# Altium footprint library Custom_Library.PcbLib: 221 footprints (part 6 of 14)
Each footprint in its own frame and in the unit in brackets; x right, y up, seen from the top. Pads: shape width x height; smd on the part's side, far side on the other; paste and mask are expansions set on the pad; w line width, h text height; cw(c..) or ccw(c..) is an arc to the next point about the centre after c.
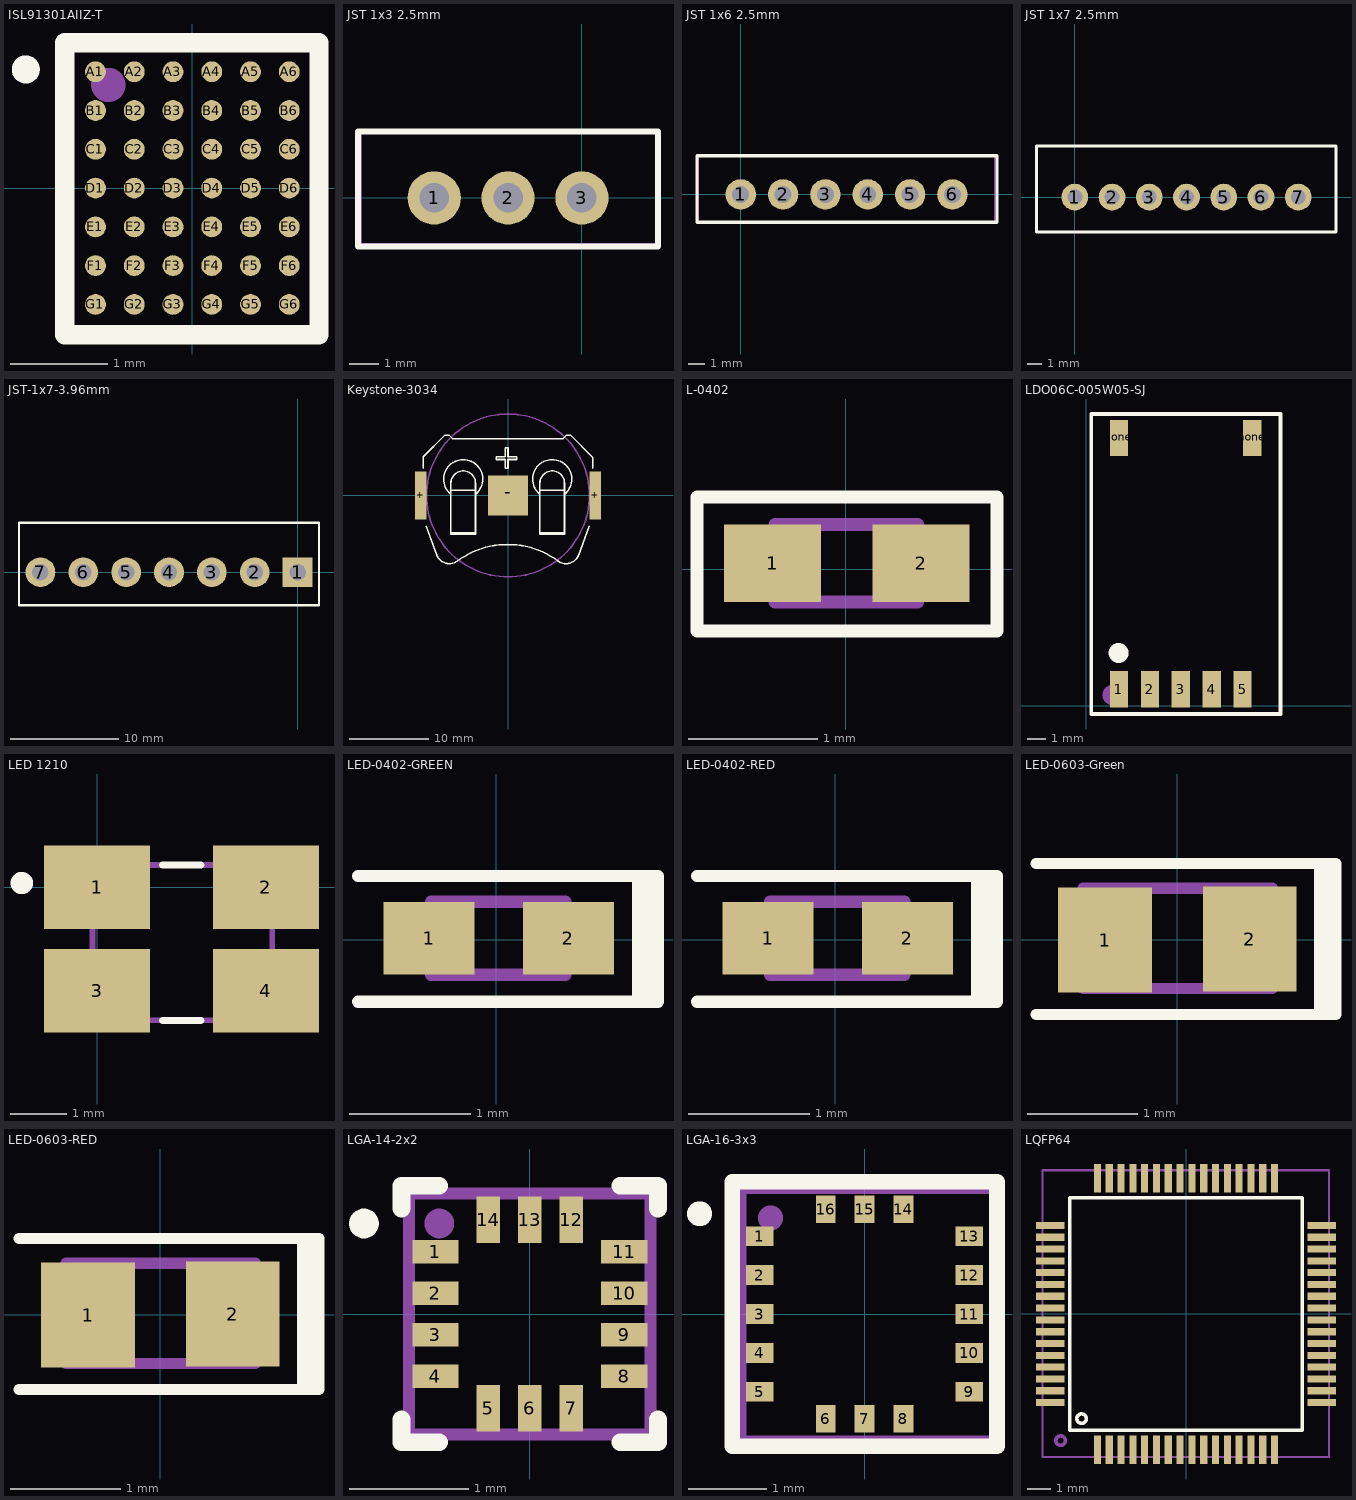
[diagram p5: the footprints below, top view; thin cyan lines are the x and y axes]

## ISL91301AIIZ-T [mm]
pads (42):
  round 0.215 smd mask+0.05: A1(-1,1.2) A2(-0.6,1.2) A3(-0.2,1.2) A4(0.2,1.2) A5(0.6,1.2) A6(1,1.2) B1(-1,0.8) B2(-0.6,0.8) B3(-0.2,0.8) B4(0.2,0.8) B5(0.6,0.8) B6(1,0.8) C1(-1,0.4) C2(-0.6,0.4) C3(-0.2,0.4) C4(0.2,0.4) C5(0.6,0.4) C6(1,0.4) D1(-1,0) D2(-0.6,0) D3(-0.2,0) D4(0.2,0) D5(0.6,0) D6(1,0) E1(-1,-0.4) E2(-0.6,-0.4) E3(-0.2,-0.4) E4(0.2,-0.4) E5(0.6,-0.4) E6(1,-0.4) F1(-1,-0.8) F2(-0.6,-0.8) F3(-0.2,-0.8) F4(0.2,-0.8) F5(0.6,-0.8) F6(1,-0.8) G1(-1,-1.2) G2(-0.6,-1.2) G3(-0.2,-1.2) G4(0.2,-1.2) G5(0.6,-1.2) G6(1,-1.2)
Top Overlay:
  circle w0.15: c-1.719,1.225 r0.07
  lines w0.2: -1.316,-1.513 1.306,-1.513 1.306,1.498 -1.316,1.498 -1.316,-1.513
Top Assembly:
  circle w0.254: c-0.868,1.064 r0.05
  lines w0.1: -1.31,-1.519 1.3,-1.519 1.3,1.5 -0.6,1.5 -1.31,1.5 -1.31,-1.519
  text "'.Designator'" at -3.213,-2.69 h1.27

## JST 1x3 2.5mm [mm]
pads (3):
  round 1.8 / inner round 1.499 / far side round 1.499 hole 1: 1(-5,0) 2(-2.5,0) 3(0,0)
Top Overlay:
  lines w0.2: -7.577,-1.641 2.574,-1.641 2.574,2.244 -7.577,2.244 -7.577,-1.641
Top Assembly:
  lines w0.1: -7.5,-1.574 -7.5,2.215 2.574,2.215 2.574,-1.574 -7.5,-1.574
  text "'.Designator'" at -5.973,1.732 h1.27
3D body: height 0.25, standoff 0, extent -5,0 -4.746,0.254
3D body "JST-B3B-EH-A.STEP": height 6, standoff -3.2, extent -7.497,-1.587 2.504,2.213

## JST 1x6 2.5mm [mm]
pads (6):
  round 1.8 / inner round 1.499 / far side round 1.499 hole 1: 1(0,0) 2(2.5,0) 3(5,0) 4(7.5,0) 5(10,0) 6(12.5,0)
Top Overlay:
  lines w0.2: -2.577,-1.627 -2.577,2.285 15.127,2.285 15.127,-1.627 -2.577,-1.627
Top Assembly:
  lines w0.1: -2.5,-1.638 15,-1.638 15,2.285 -2.5,2.285 -2.5,-1.638
  text "'.Designator'" at 2.666,1.653 h1.27
3D body: height 0.25, standoff 0, extent 0,0 0.254,0.254
3D body "JST-B6B-EH-A.STEP": height 6, standoff -3.2, extent -2.496,-1.593 15.004,2.207

## JST 1x7 2.5mm [mm]
pads (7):
  round 1.8 / inner round 1.499 / far side round 1.499 hole 1: 1(0,0) 2(2.5,0) 3(5,0) 4(7.5,0) 5(10,0) 6(12.5,0) 7(15,0)
Top Overlay:
  lines w0.2: -2.577,-2.331 -2.577,3.426 17.536,3.426 17.536,-2.331 -2.577,-2.331
Top Assembly:
  lines w0.1: -2.606,-2.341 17.504,-2.341 17.504,3.415 -2.606,3.415 -2.606,-2.341
  text "'.Designator'" at 2.666,1.653 h1.27
3D body: height 0.25, standoff 0, extent 0,0 0.254,0.254
3D body "JST B7B-XH-A Through-hole shrouded header top entry type.STEP": height 7.1, standoff -3.3, extent -2.581,-2.324 17.499,3.426

## JST-1x7-3.96mm [mm]
pads (7):
  rect 2.75x2.75 hole 1.52: 1(0,0)
  round 2.75 hole 1.52: 2(-3.96,0) 3(-7.92,0) 4(-11.88,0) 5(-15.84,0) 6(-19.8,0) 7(-23.76,0)
Top Overlay:
  lines w0.2: -25.74,-3.05 -25.74,4.57 1.98,4.57 1.98,-3.05 -25.74,-3.05
Top Assembly:
  lines w0.1: -25.74,-3.05 -25.74,4.57 1.98,4.57 1.98,-3.05 -25.74,-3.05
  text "'.Designator'" at -15.513,3.01 h1.27
3D body "644752-7.STEP": height 13.36, standoff -4.42, extent -25.748,-3.048 1.988,4.572

## Keystone-3034 [mm]
pads (3):
  rect 1.5x6 smd: +(-10.985,0) +(10.985,0)
  rect 5x5 smd: -(0,0)
Top Overlay:
  lines w0.2: -10.67,3.41 -10.67,4.858 -7.932,7.595 -7.429,7.595 -6.989,7.155 6.917,7.155 7.357,7.595 7.86,7.595 10.67,4.786 10.67,3.41 ; -10.314,-3.881 -8.97,-7.475 ccw(c-7.376,-6.879) -6.366,-8.249 cw(c-0.036,-16.836) 6.294,-8.249 ccw(c7.304,-6.879) 8.898,-7.475 10.25,-3.858 ; -7.186,-4.898 -7.186,1.54 cw(c-5.637,1.54) -4.087,1.54 -4.087,-4.898 ; -7.186,-4.724 -4.087,-4.724 ; -7.186,0.676 -4.087,0.676 ; 4.015,-4.898 4.015,1.54 cw(c5.565,1.54) 7.114,1.54 7.114,-4.898 ; 4.015,-4.724 7.114,-4.724 ; 4.015,0.676 7.114,0.676 ; -7.211,-4.898 -7.211,0.164 cw(c-5.637,2.052) -4.062,0.164 -4.062,-4.898 -7.211,-4.898 ; -1.465,4.522 -1.465,4.864 -0.342,4.864 -0.342,5.987 0,5.987 0,4.864 1.123,4.864 1.123,4.522 0,4.522 0,3.398 -0.342,3.398 -0.342,4.522 -1.465,4.522 ; 3.99,-4.898 7.14,-4.898 7.14,0.164 ccw(c5.565,2.054) 3.99,0.164 3.99,-4.898
Top Assembly:
  circle w0.2: c0,0 r10.25
  text "'.Designator'" at -3.457,3.469 h1.27
3D body "User Library-keystone-PN3034.STEP": height 4.05, standoff -0.01, extent -11.62,-8.729 11.621,7.75

## L-0402 [mm] "Chip Capacitor, Body 1.0x0.5mm, IPC High Density"
height 1.3
pads (2):
  rect 0.75x0.6 smd: 1(-0.567,0.046) 2(0.583,0.046)
Top Overlay:
  lines w0.1: -1.153,-0.478 1.171,-0.478 1.171,0.558 -1.153,0.558 -1.153,-0.478
Top Assembly:
  lines w0.1: -0.55,-0.255 -0.55,0.347 0.557,0.347 0.557,-0.255 -0.55,-0.255
  text "'.Designator'" at -0.514,-1.372 h1.27
3D body "CAPC0402 v2.step": height 0.49, standoff -0.01, extent -0.496,-0.204 0.504,0.296

## LDO06C-005W05-SJ [mm]
pads (7):
  rect 1x2 smd: 1(1.8,0.89) 2(3.51,0.89) 3(5.21,0.89) 4(6.91,0.89) 5(8.61,0.89) none(1.8,14.73) none(9.14,14.73)
Top Overlay:
  circle w0.6: c1.789,2.895 r0.25
  lines w0.2: 0.288,-0.463 0.288,16.047 10.698,16.047 10.698,-0.463 0.288,-0.463
Top Assembly:
  circle w0.6: c1.447,0.581 r0.25
  lines w0.1: 0.294,-0.461 0.294,16.049 10.704,16.049 10.704,-0.461 0.294,-0.461
  text "'.Designator'" at 2.049,7.594 h1.27
3D body: height 11.2, standoff 0, extent 0.294,-0.461 10.704,16.049

## LED 1210 [mm]
pads (4):
  rect 1.9x1.5 smd: 1(0,0) 2(3.021,0) 3(0,-1.85) 4(3.021,-1.85)
Top Overlay:
  circle w0.3: c-1.349,0.077 r0.05
  lines w0.127: 1.168,-2.382 1.398,-2.382 1.86,-2.382 ; 1.17,0.4 1.236,0.4 1.86,0.4
Top Assembly:
  circle w0.3: c0.402,-0.046 r0.05
  lines w0.1: -0.083,-2.382 1.398,-2.382 3.136,-2.382 3.136,-0.929 3.136,0.4 1.5,0.4 -0.083,0.4 -0.083,-0.882 -0.083,-2.382
  text "'.Designator'" at -1.649,-4.023 h1.27
3D body "1210_bi_and_tri.stp": height 0.7, standoff -0.01, extent -0.1,-2.346 3.1,0.346

## LED-0402-GREEN [mm]
height 1.3
pads (2):
  rect 0.75x0.6 smd: 1(-0.556,0.014) 2(0.594,0.014)
Top Overlay:
  lines w0.1: -1.142,-0.51 1.259,-0.51 1.259,0.526 ; -1.142,0.526 1.259,0.526 ; 1.169,0.516 1.169,-0.511 1.332,-0.51 1.332,0.526 1.259,0.526
Top Assembly:
  lines w0.1: -0.539,-0.287 0.568,-0.287 0.568,0.315 -0.539,0.315 -0.539,-0.287
  text "'.Designator'" at -2.951,-1.606 h1.27
3D body "ChipLedWith-Green.stp": height 0.16, standoff 0, extent -0.502,-0.252 0.502,0.252

## LED-0402-RED [mm]
height 1.3
pads (2):
  rect 0.75x0.6 smd: 1(-0.556,0.014) 2(0.594,0.014)
Top Overlay:
  lines w0.1: -1.142,-0.51 1.259,-0.51 1.259,0.526 ; -1.142,0.526 1.259,0.526 ; 1.169,0.516 1.169,-0.511 1.332,-0.51 1.332,0.526 1.259,0.526
Top Assembly:
  lines w0.1: -0.539,-0.287 0.568,-0.287 0.568,0.315 -0.539,0.315 -0.539,-0.287
  text "'.Designator'" at -2.951,-1.606 h1.27
3D body "ChipLedWith-Red.stp": height 0.16, standoff 0, extent -0.502,-0.252 0.502,0.252

## LED-0603-Green [mm] "Chip Resistor, 2-Leads, Body 1.60x0.80mm, IPC Medium Density"
height 0.45
pads (2):
  rect 0.85x0.95 smd: 1(-0.655,-0.005) 2(0.655,0.005)
Top Overlay:
  lines w0.1: -1.281,-0.68 1.288,-0.68 ; -1.281,0.691 1.288,0.691 ; 1.319,0.691 1.436,0.691 1.436,-0.68 1.288,-0.68 ; 1.35,-0.68 1.35,0.691 1.288,0.691 ; 1.288,-0.68 1.288,0.691
Top Assembly:
  lines w0.1: -0.856,-0.441 -0.856,0.465 -0.797,0.465 0.862,0.465 0.862,-0.441 -0.856,-0.441
  text "'.Designator'" at -2.79,-1.783 h1.27
3D body "LED Green SMD 0603 Würth 150060BS55040.stp": height 0.4, standoff 0, extent -0.8,-0.4 0.8,0.4

## LED-0603-RED [mm] "Chip Resistor, 2-Leads, Body 1.60x0.80mm, IPC Medium Density"
height 0.45
pads (2):
  rect 0.85x0.95 smd: 1(-0.655,-0.005) 2(0.655,0.005)
Top Overlay:
  lines w0.1: -1.281,-0.68 1.288,-0.68 ; -1.281,0.691 1.288,0.691 ; 1.319,0.691 1.436,0.691 1.436,-0.68 1.288,-0.68 ; 1.35,-0.68 1.35,0.691 1.288,0.691 ; 1.288,-0.68 1.288,0.691
Top Assembly:
  lines w0.1: -0.856,-0.441 0.862,-0.441 0.862,0.465 -0.797,0.465 -0.856,0.465 -0.856,-0.441
  text "'.Designator'" at -3.196,-1.747 h1.27
3D body "LED Red SMD 0603 Würth 150060SS55040.stp": height 0.4, standoff 0, extent -0.8,-0.4 0.8,0.4

## LGA-14-2x2 [mm]
pads (14):
  rect 0.39x0.2 smd: 1(-0.795,0.525) 2(-0.795,0.175) 3(-0.795,-0.175) 4(-0.795,-0.525) 8(0.795,-0.525) 9(0.795,-0.175) 10(0.795,0.175) 11(0.795,0.525)
  rect 0.2x0.39 smd: 5(-0.35,-0.795) 6(0,-0.795) 7(0.35,-0.795) 12(0.35,0.795) 13(0,0.795) 14(-0.35,0.795)
Top Overlay:
  circle w0.15: c-1.397,0.762 r0.05
  lines w0.15: -1.08,-0.889 -1.08,-1.08 -0.762,-1.08 ; -1.08,0.889 -1.08,1.08 -0.762,1.08 ; 0.762,-1.08 1.08,-1.08 1.08,-0.889 ; 0.762,1.08 1.08,1.08 1.08,0.889
Top Assembly:
  circle w0.15: c-0.762,0.762 r0.05
  lines w0.1: -1.016,-1.016 1.016,-1.016 1.016,1.016 -1.016,1.016 -1.016,-1.016
  text "'.Designator'" at -0.384,-0.379 h1
3D body: height 1, standoff 0, extent -1.016,-1.016 1.016,1.016

## LGA-16-3x3 [mil]
pads (16):
  rect 14x10 smd paste-1.4 mask+2: 1(-53,39.37) 2(-53,19.68) 3(-53,0) 4(-53,-19.68) 5(-53,-39.37) 9(53,-39.37) 10(53,-19.68) 11(53,0) 12(53,19.68) 13(53,39.37)
  rect 10x14 smd paste-1.4 mask+2: 6(-19.68,-53) 7(0,-53) 8(19.68,-53) 14(19.68,53) 15(0,53) 16(-19.68,53)
Top Overlay:
  circle w10: c-83.48,50.72 r1.31
  lines w7.87: -67,-67 -67,-55.44 -67,67 35.76,67 67,67 67,-55.44 67,-67 35.76,-67 -67,-67
Top Assembly:
  circle w10: c-47.6,48.58 r1.31
  lines w3.94: -61.64,-63.39 65,-63.39 65,62.62 -61.64,62.62 -61.64,-63.39
  text "'.Designator'" at -105.1,-109.93 h39.37
3D body "LGA-16_3x3x1mm_STM.step": height 39.09, standoff 0, extent -62,-62 62.01,62.01

## LQFP64 [mm] "LQFP64"
pads (64):
  rect 0.3x1.2 smd mask+0.05: 1(-3.75,-5.75) 2(-3.25,-5.75) 3(-2.75,-5.75) 4(-2.25,-5.75) 5(-1.75,-5.75) 6(-1.25,-5.75) 7(-0.75,-5.75) 8(-0.25,-5.75) 9(0.25,-5.75) 10(0.75,-5.75) 11(1.25,-5.75) 12(1.75,-5.75) 13(2.25,-5.75) 14(2.75,-5.75) 15(3.25,-5.75) 16(3.75,-5.75) 33(3.75,5.75) 34(3.25,5.75) 35(2.75,5.75) 36(2.25,5.75) 37(1.75,5.75) 38(1.25,5.75) 39(0.75,5.75) 40(0.25,5.75) 41(-0.25,5.75) 42(-0.75,5.75) 43(-1.25,5.75) 44(-1.75,5.75) 45(-2.25,5.75) 46(-2.75,5.75) 47(-3.25,5.75) 48(-3.75,5.75)
  rect 1.2x0.3 smd mask+0.05: 17(5.75,-3.75) 18(5.75,-3.25) 19(5.75,-2.75) 20(5.75,-2.25) 21(5.75,-1.75) 22(5.75,-1.25) 23(5.75,-0.75) 24(5.75,-0.25) 25(5.75,0.25) 26(5.75,0.75) 27(5.75,1.25) 28(5.75,1.75) 29(5.75,2.25) 30(5.75,2.75) 31(5.75,3.25) 32(5.75,3.75) 49(-5.75,3.75) 50(-5.75,3.25) 51(-5.75,2.75) 52(-5.75,2.25) 53(-5.75,1.75) 54(-5.75,1.25) 55(-5.75,0.75) 56(-5.75,0.25) 57(-5.75,-0.25) 58(-5.75,-0.75) 59(-5.75,-1.25) 60(-5.75,-1.75) 61(-5.75,-2.25) 62(-5.75,-2.75) 63(-5.75,-3.25) 64(-5.75,-3.75)
Top Overlay:
  circle w0.15: c-4.42,-4.43 r0.2
  lines w0.15: -4.92,-4.92 4.92,-4.92 4.92,4.92 -4.92,4.92 -4.92,-4.92
Top Assembly:
  circle w0.15: c-5.31,-5.36 r0.2
  lines w0.1: -6.075,-6.051 6.055,-6.051 6.055,6.081 -5.825,6.081 -6.075,6.081 -6.075,-6.051
  text "'.Designator'" at -0.648,0.723 h2
3D body "STM32F103RDT6.STEP": height 1.46, standoff -0.02, extent -5.998,-5.996 6.002,6.004